# Altium footprint library CONN_HDR_1.27MM_ST_SMD.PcbLib: 118 footprints (part 4 of 8)
Each footprint in its own frame and in the unit in brackets; x right, y up, seen from the top. Pads: shape width x height; smd on the part's side, far side on the other; paste and mask are expansions set on the pad; w line width, h text height; cw(c..) or ccw(c..) is an arc to the next point about the centre after c.
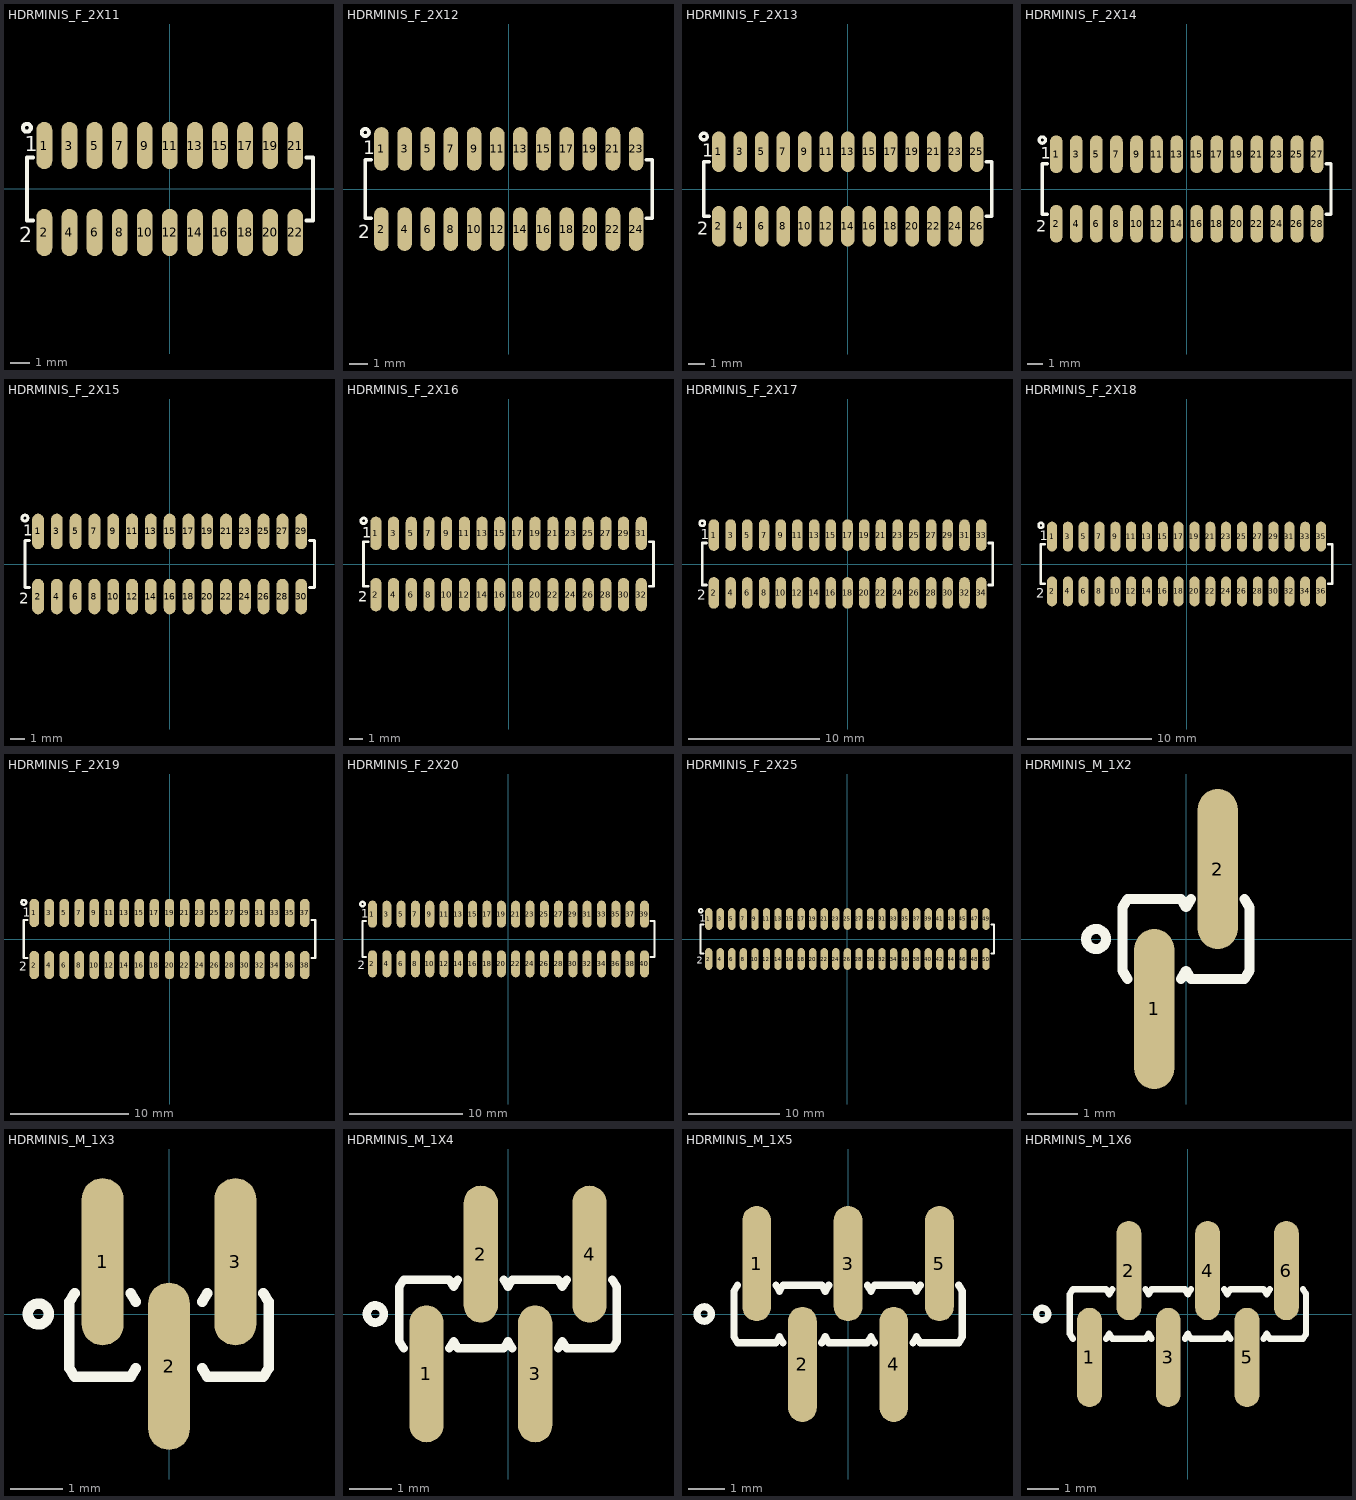
[diagram p3: the footprints below, top view; thin cyan lines are the x and y axes]

## HDRMINIS_F_2X11 [mm] "HEADER FEMALE, SMT, 20, 1.27mm"
pads (22):
  oval 0.8x2.4 smd mask+0.1: 1(-6.35,2.2) 2(-6.35,-2.2) 3(-5.08,2.2) 4(-5.08,-2.2) 5(-3.81,2.2) 6(-3.81,-2.2) 7(-2.54,2.2) 8(-2.54,-2.2) 9(-1.27,2.2) 10(-1.27,-2.2) 11(0,2.2) 12(0,-2.2) 13(1.27,2.2) 14(1.27,-2.2) 15(2.54,2.2) 16(2.54,-2.2) 17(3.81,2.2) 18(3.81,-2.2) 19(5.08,2.2) 20(5.08,-2.2) 21(6.35,2.2) 22(6.35,-2.2)
Top Overlay:
  circle w0.2: c-7.235,3.1 r0.2
  lines w0.2: -6.915,-1.6 -7.235,-1.6 -7.235,1.6 -6.915,1.6 ; 6.915,-1.6 7.235,-1.6 7.235,1.6 6.915,1.6
  text "1" at -7.335,1.9 h0.75
  text "2" at -7.635,-2.7 h0.75
3D body "User Library-1_27x1_27-SMD-female-2x2.step": height 4.5, standoff 0, extent 2.985,-2.3 5.905,2.3
3D body "User Library-1_27x1_27-SMD-female-2x2.step": height 4.5, standoff 0, extent 0.445,-2.3 3.365,2.3
3D body "User Library-1_27x1_27-SMD-female-2x2.step": height 4.5, standoff 0, extent -2.095,-2.3 0.825,2.3
3D body "User Library-1_27x1_27-SMD-female-2x2.step": height 4.5, standoff 0, extent -4.635,-2.3 -1.715,2.3
3D body "User Library-1_27x1_27-SMD-female-2x2.step": height 4.5, standoff 0, extent -7.175,-2.3 -4.255,2.3
3D body "User Library-1_27x1_27-SMD-female-2x2.step": height 4.5, standoff 0, extent 4.255,-2.3 7.175,2.3

## HDRMINIS_F_2X12 [mm] "HEADER FEMALE, SMT, 1.27mm"
pads (24):
  oval 0.8x2.4 smd mask+0.1: 1(-6.985,2.2) 2(-6.985,-2.2) 3(-5.715,2.2) 4(-5.715,-2.2) 5(-4.445,2.2) 6(-4.445,-2.2) 7(-3.175,2.2) 8(-3.175,-2.2) 9(-1.905,2.2) 10(-1.905,-2.2) 11(-0.635,2.2) 12(-0.635,-2.2) 13(0.635,2.2) 14(0.635,-2.2) 15(1.905,2.2) 16(1.905,-2.2) 17(3.175,2.2) 18(3.175,-2.2) 19(4.445,2.2) 20(4.445,-2.2) 21(5.715,2.2) 22(5.715,-2.2) 23(6.985,2.2) 24(6.985,-2.2)
Top Overlay:
  circle w0.2: c-7.87,3.1 r0.2
  lines w0.2: -7.55,-1.6 -7.87,-1.6 -7.87,1.6 -7.55,1.6 ; 7.55,-1.6 7.87,-1.6 7.87,1.6 7.55,1.6
  text "1" at -7.97,1.9 h0.75
  text "2" at -8.27,-2.7 h0.75
3D body "User Library-1_27x1_27-SMD-female-2x2.step": height 4.5, standoff 0, extent 2.35,-2.3 5.27,2.3
3D body "User Library-1_27x1_27-SMD-female-2x2.step": height 4.5, standoff 0, extent -0.19,-2.3 2.73,2.3
3D body "User Library-1_27x1_27-SMD-female-2x2.step": height 4.5, standoff 0, extent -2.73,-2.3 0.19,2.3
3D body "User Library-1_27x1_27-SMD-female-2x2.step": height 4.5, standoff 0, extent -5.27,-2.3 -2.35,2.3
3D body "User Library-1_27x1_27-SMD-female-2x2.step": height 4.5, standoff 0, extent -7.81,-2.3 -4.89,2.3
3D body "User Library-1_27x1_27-SMD-female-2x2.step": height 4.5, standoff 0, extent 4.89,-2.3 7.81,2.3

## HDRMINIS_F_2X13 [mm] "HEADER FEMALE, SMT, 1.27mm"
pads (26):
  oval 0.8x2.4 smd mask+0.1: 1(-7.62,2.2) 2(-7.62,-2.2) 3(-6.35,2.2) 4(-6.35,-2.2) 5(-5.08,2.2) 6(-5.08,-2.2) 7(-3.81,2.2) 8(-3.81,-2.2) 9(-2.54,2.2) 10(-2.54,-2.2) 11(-1.27,2.2) 12(-1.27,-2.2) 13(0,2.2) 14(0,-2.2) 15(1.27,2.2) 16(1.27,-2.2) 17(2.54,2.2) 18(2.54,-2.2) 19(3.81,2.2) 20(3.81,-2.2) 21(5.08,2.2) 22(5.08,-2.2) 23(6.35,2.2) 24(6.35,-2.2) 25(7.62,2.2) 26(7.62,-2.2)
Top Overlay:
  circle w0.2: c-8.505,3.1 r0.2
  lines w0.2: -8.185,-1.6 -8.505,-1.6 -8.505,1.6 -8.185,1.6 ; 8.185,-1.6 8.505,-1.6 8.505,1.6 8.185,1.6
  text "1" at -8.605,1.9 h0.75
  text "2" at -8.905,-2.7 h0.75
3D body "User Library-1_27x1_27-SMD-female-2x2.step": height 4.5, standoff 0, extent 1.715,-2.3 4.635,2.3
3D body "User Library-1_27x1_27-SMD-female-2x2.step": height 4.5, standoff 0, extent -0.825,-2.3 2.095,2.3
3D body "User Library-1_27x1_27-SMD-female-2x2.step": height 4.5, standoff 0, extent -3.365,-2.3 -0.445,2.3
3D body "User Library-1_27x1_27-SMD-female-2x2.step": height 4.5, standoff 0, extent -5.905,-2.3 -2.985,2.3
3D body "User Library-1_27x1_27-SMD-female-2x2.step": height 4.5, standoff 0, extent -8.445,-2.3 -5.525,2.3
3D body "User Library-1_27x1_27-SMD-female-2x2.step": height 4.5, standoff 0, extent 4.255,-2.3 7.175,2.3
3D body "User Library-1_27x1_27-SMD-female-2x2.step": height 4.5, standoff 0, extent 5.525,-2.3 8.445,2.3

## HDRMINIS_F_2X14 [mm] "HEADER FEMALE, SMT, 1.27mm"
pads (28):
  oval 0.8x2.4 smd mask+0.1: 1(-8.255,2.2) 2(-8.255,-2.2) 3(-6.985,2.2) 4(-6.985,-2.2) 5(-5.715,2.2) 6(-5.715,-2.2) 7(-4.445,2.2) 8(-4.445,-2.2) 9(-3.175,2.2) 10(-3.175,-2.2) 11(-1.905,2.2) 12(-1.905,-2.2) 13(-0.635,2.2) 14(-0.635,-2.2) 15(0.635,2.2) 16(0.635,-2.2) 17(1.905,2.2) 18(1.905,-2.2) 19(3.175,2.2) 20(3.175,-2.2) 21(4.445,2.2) 22(4.445,-2.2) 23(5.715,2.2) 24(5.715,-2.2) 25(6.985,2.2) 26(6.985,-2.2) 27(8.255,2.2) 28(8.255,-2.2)
Top Overlay:
  circle w0.2: c-9.14,3.1 r0.2
  lines w0.2: -8.82,-1.6 -9.14,-1.6 -9.14,1.6 -8.82,1.6 ; 8.82,-1.6 9.14,-1.6 9.14,1.6 8.82,1.6
  text "2" at -9.54,-2.7 h0.75
  text "1" at -9.24,1.9 h0.75
3D body "User Library-1_27x1_27-SMD-female-2x2.step": height 4.5, standoff 0, extent 6.16,-2.3 9.08,2.3
3D body "User Library-1_27x1_27-SMD-female-2x2.step": height 4.5, standoff 0, extent 3.62,-2.3 6.54,2.3
3D body "User Library-1_27x1_27-SMD-female-2x2.step": height 4.5, standoff 0, extent -9.08,-2.3 -6.16,2.3
3D body "User Library-1_27x1_27-SMD-female-2x2.step": height 4.5, standoff 0, extent -6.54,-2.3 -3.62,2.3
3D body "User Library-1_27x1_27-SMD-female-2x2.step": height 4.5, standoff 0, extent -4,-2.3 -1.08,2.3
3D body "User Library-1_27x1_27-SMD-female-2x2.step": height 4.5, standoff 0, extent -1.46,-2.3 1.46,2.3
3D body "User Library-1_27x1_27-SMD-female-2x2.step": height 4.5, standoff 0, extent 1.08,-2.3 4,2.3

## HDRMINIS_F_2X15 [mm] "HEADER FEMALE, SMT, 1.27mm"
pads (30):
  oval 0.8x2.4 smd mask+0.1: 1(-8.89,2.2) 2(-8.89,-2.2) 3(-7.62,2.2) 4(-7.62,-2.2) 5(-6.35,2.2) 6(-6.35,-2.2) 7(-5.08,2.2) 8(-5.08,-2.2) 9(-3.81,2.2) 10(-3.81,-2.2) 11(-2.54,2.2) 12(-2.54,-2.2) 13(-1.27,2.2) 14(-1.27,-2.2) 15(0,2.2) 16(0,-2.2) 17(1.27,2.2) 18(1.27,-2.2) 19(2.54,2.2) 20(2.54,-2.2) 21(3.81,2.2) 22(3.81,-2.2) 23(5.08,2.2) 24(5.08,-2.2) 25(6.35,2.2) 26(6.35,-2.2) 27(7.62,2.2) 28(7.62,-2.2) 29(8.89,2.2) 30(8.89,-2.2)
Top Overlay:
  circle w0.2: c-9.775,3.1 r0.2
  lines w0.2: -9.455,-1.6 -9.775,-1.6 -9.775,1.6 -9.455,1.6 ; 9.455,-1.6 9.775,-1.6 9.775,1.6 9.455,1.6
  text "1" at -9.875,1.9 h0.75
  text "2" at -10.175,-2.7 h0.75
3D body "User Library-1_27x1_27-SMD-female-2x2.step": height 4.5, standoff 0, extent 0.445,-2.3 3.365,2.3
3D body "User Library-1_27x1_27-SMD-female-2x2.step": height 4.5, standoff 0, extent -2.095,-2.3 0.825,2.3
3D body "User Library-1_27x1_27-SMD-female-2x2.step": height 4.5, standoff 0, extent -4.635,-2.3 -1.715,2.3
3D body "User Library-1_27x1_27-SMD-female-2x2.step": height 4.5, standoff 0, extent -7.175,-2.3 -4.255,2.3
3D body "User Library-1_27x1_27-SMD-female-2x2.step": height 4.5, standoff 0, extent -9.715,-2.3 -6.795,2.3
3D body "User Library-1_27x1_27-SMD-female-2x2.step": height 4.5, standoff 0, extent 2.985,-2.3 5.905,2.3
3D body "User Library-1_27x1_27-SMD-female-2x2.step": height 4.5, standoff 0, extent 5.525,-2.3 8.445,2.3
3D body "User Library-1_27x1_27-SMD-female-2x2.step": height 4.5, standoff 0, extent 6.795,-2.3 9.715,2.3

## HDRMINIS_F_2X16 [mm] "HEADER FEMALE, SMT, 1.27mm"
pads (32):
  oval 0.8x2.4 smd mask+0.1: 1(-9.525,2.2) 2(-9.525,-2.2) 3(-8.255,2.2) 4(-8.255,-2.2) 5(-6.985,2.2) 6(-6.985,-2.2) 7(-5.715,2.2) 8(-5.715,-2.2) 9(-4.445,2.2) 10(-4.445,-2.2) 11(-3.175,2.2) 12(-3.175,-2.2) 13(-1.905,2.2) 14(-1.905,-2.2) 15(-0.635,2.2) 16(-0.635,-2.2) 17(0.635,2.2) 18(0.635,-2.2) 19(1.905,2.2) 20(1.905,-2.2) 21(3.175,2.2) 22(3.175,-2.2) 23(4.445,2.2) 24(4.445,-2.2) 25(5.715,2.2) 26(5.715,-2.2) 27(6.985,2.2) 28(6.985,-2.2) 29(8.255,2.2) 30(8.255,-2.2) 31(9.525,2.2) 32(9.525,-2.2)
Top Overlay:
  circle w0.2: c-10.41,3.1 r0.2
  lines w0.2: -10.09,-1.6 -10.41,-1.6 -10.41,1.6 -10.09,1.6 ; 10.09,-1.6 10.41,-1.6 10.41,1.6 10.09,1.6
  text "2" at -10.81,-2.7 h0.75
  text "1" at -10.51,1.9 h0.75
3D body "User Library-1_27x1_27-SMD-female-2x2.step": height 4.5, standoff 0, extent 7.43,-2.3 10.35,2.3
3D body "User Library-1_27x1_27-SMD-female-2x2.step": height 4.5, standoff 0, extent 4.89,-2.3 7.81,2.3
3D body "User Library-1_27x1_27-SMD-female-2x2.step": height 4.5, standoff 0, extent 2.35,-2.3 5.27,2.3
3D body "User Library-1_27x1_27-SMD-female-2x2.step": height 4.5, standoff 0, extent -10.35,-2.3 -7.43,2.3
3D body "User Library-1_27x1_27-SMD-female-2x2.step": height 4.5, standoff 0, extent -7.81,-2.3 -4.89,2.3
3D body "User Library-1_27x1_27-SMD-female-2x2.step": height 4.5, standoff 0, extent -5.27,-2.3 -2.35,2.3
3D body "User Library-1_27x1_27-SMD-female-2x2.step": height 4.5, standoff 0, extent -2.73,-2.3 0.19,2.3
3D body "User Library-1_27x1_27-SMD-female-2x2.step": height 4.5, standoff 0, extent -0.19,-2.3 2.73,2.3

## HDRMINIS_F_2X17 [mm] "HEADER FEMALE, SMT, 1.27mm"
pads (34):
  oval 0.8x2.4 smd mask+0.1: 1(-10.16,2.2) 2(-10.16,-2.2) 3(-8.89,2.2) 4(-8.89,-2.2) 5(-7.62,2.2) 6(-7.62,-2.2) 7(-6.35,2.2) 8(-6.35,-2.2) 9(-5.08,2.2) 10(-5.08,-2.2) 11(-3.81,2.2) 12(-3.81,-2.2) 13(-2.54,2.2) 14(-2.54,-2.2) 15(-1.27,2.2) 16(-1.27,-2.2) 17(0,2.2) 18(0,-2.2) 19(1.27,2.2) 20(1.27,-2.2) 21(2.54,2.2) 22(2.54,-2.2) 23(3.81,2.2) 24(3.81,-2.2) 25(5.08,2.2) 26(5.08,-2.2) 27(6.35,2.2) 28(6.35,-2.2) 29(7.62,2.2) 30(7.62,-2.2) 31(8.89,2.2) 32(8.89,-2.2) 33(10.16,2.2) 34(10.16,-2.2)
Top Overlay:
  circle w0.2: c-11.045,3.1 r0.2
  lines w0.2: -10.725,-1.6 -11.045,-1.6 -11.045,1.6 -10.725,1.6 ; 10.725,-1.6 11.045,-1.6 11.045,1.6 10.725,1.6
  text "1" at -11.145,1.9 h0.75
  text "2" at -11.445,-2.7 h0.75
3D body "User Library-1_27x1_27-SMD-female-2x2.step": height 4.5, standoff 0, extent -0.825,-2.3 2.095,2.3
3D body "User Library-1_27x1_27-SMD-female-2x2.step": height 4.5, standoff 0, extent -3.365,-2.3 -0.445,2.3
3D body "User Library-1_27x1_27-SMD-female-2x2.step": height 4.5, standoff 0, extent -5.905,-2.3 -2.985,2.3
3D body "User Library-1_27x1_27-SMD-female-2x2.step": height 4.5, standoff 0, extent -8.445,-2.3 -5.525,2.3
3D body "User Library-1_27x1_27-SMD-female-2x2.step": height 4.5, standoff 0, extent -10.985,-2.3 -8.065,2.3
3D body "User Library-1_27x1_27-SMD-female-2x2.step": height 4.5, standoff 0, extent 1.715,-2.3 4.635,2.3
3D body "User Library-1_27x1_27-SMD-female-2x2.step": height 4.5, standoff 0, extent 4.255,-2.3 7.175,2.3
3D body "User Library-1_27x1_27-SMD-female-2x2.step": height 4.5, standoff 0, extent 6.795,-2.3 9.715,2.3
3D body "User Library-1_27x1_27-SMD-female-2x2.step": height 4.5, standoff 0, extent 8.065,-2.3 10.985,2.3

## HDRMINIS_F_2X18 [mm] "HEADER FEMALE, SMT, 1.27mm"
pads (36):
  oval 0.8x2.4 smd mask+0.1: 1(-10.795,2.2) 2(-10.795,-2.2) 3(-9.525,2.2) 4(-9.525,-2.2) 5(-8.255,2.2) 6(-8.255,-2.2) 7(-6.985,2.2) 8(-6.985,-2.2) 9(-5.715,2.2) 10(-5.715,-2.2) 11(-4.445,2.2) 12(-4.445,-2.2) 13(-3.175,2.2) 14(-3.175,-2.2) 15(-1.905,2.2) 16(-1.905,-2.2) 17(-0.635,2.2) 18(-0.635,-2.2) 19(0.635,2.2) 20(0.635,-2.2) 21(1.905,2.2) 22(1.905,-2.2) 23(3.175,2.2) 24(3.175,-2.2) 25(4.445,2.2) 26(4.445,-2.2) 27(5.715,2.2) 28(5.715,-2.2) 29(6.985,2.2) 30(6.985,-2.2) 31(8.255,2.2) 32(8.255,-2.2) 33(9.525,2.2) 34(9.525,-2.2) 35(10.795,2.2) 36(10.795,-2.2)
Top Overlay:
  circle w0.2: c-11.68,3.1 r0.2
  lines w0.2: -11.36,-1.6 -11.68,-1.6 -11.68,1.6 -11.36,1.6 ; 11.36,-1.6 11.68,-1.6 11.68,1.6 11.36,1.6
  text "1" at -11.78,1.9 h0.75
  text "2" at -12.08,-2.7 h0.75
3D body "User Library-1_27x1_27-SMD-female-2x2.step": height 4.5, standoff 0, extent -1.46,-2.3 1.46,2.3
3D body "User Library-1_27x1_27-SMD-female-2x2.step": height 4.5, standoff 0, extent -4,-2.3 -1.08,2.3
3D body "User Library-1_27x1_27-SMD-female-2x2.step": height 4.5, standoff 0, extent -6.54,-2.3 -3.62,2.3
3D body "User Library-1_27x1_27-SMD-female-2x2.step": height 4.5, standoff 0, extent -9.08,-2.3 -6.16,2.3
3D body "User Library-1_27x1_27-SMD-female-2x2.step": height 4.5, standoff 0, extent -11.62,-2.3 -8.7,2.3
3D body "User Library-1_27x1_27-SMD-female-2x2.step": height 4.5, standoff 0, extent 1.08,-2.3 4,2.3
3D body "User Library-1_27x1_27-SMD-female-2x2.step": height 4.5, standoff 0, extent 3.62,-2.3 6.54,2.3
3D body "User Library-1_27x1_27-SMD-female-2x2.step": height 4.5, standoff 0, extent 6.16,-2.3 9.08,2.3
3D body "User Library-1_27x1_27-SMD-female-2x2.step": height 4.5, standoff 0, extent 8.7,-2.3 11.62,2.3

## HDRMINIS_F_2X19 [mm] "HEADER FEMALE, SMT, 1.27mm"
pads (38):
  oval 0.8x2.4 smd mask+0.1: 1(-11.43,2.2) 2(-11.43,-2.2) 3(-10.16,2.2) 4(-10.16,-2.2) 5(-8.89,2.2) 6(-8.89,-2.2) 7(-7.62,2.2) 8(-7.62,-2.2) 9(-6.35,2.2) 10(-6.35,-2.2) 11(-5.08,2.2) 12(-5.08,-2.2) 13(-3.81,2.2) 14(-3.81,-2.2) 15(-2.54,2.2) 16(-2.54,-2.2) 17(-1.27,2.2) 18(-1.27,-2.2) 19(0,2.2) 20(0,-2.2) 21(1.27,2.2) 22(1.27,-2.2) 23(2.54,2.2) 24(2.54,-2.2) 25(3.81,2.2) 26(3.81,-2.2) 27(5.08,2.2) 28(5.08,-2.2) 29(6.35,2.2) 30(6.35,-2.2) 31(7.62,2.2) 32(7.62,-2.2) 33(8.89,2.2) 34(8.89,-2.2) 35(10.16,2.2) 36(10.16,-2.2) 37(11.43,2.2) 38(11.43,-2.2)
Top Overlay:
  circle w0.2: c-12.315,3.1 r0.2
  lines w0.2: -11.995,-1.6 -12.315,-1.6 -12.315,1.6 -11.995,1.6 ; 11.995,-1.6 12.315,-1.6 12.315,1.6 11.995,1.6
  text "2" at -12.715,-2.7 h0.75
  text "1" at -12.415,1.9 h0.75
3D body "User Library-1_27x1_27-SMD-female-2x2.step": height 4.5, standoff 0, extent 8.065,-2.3 10.985,2.3
3D body "User Library-1_27x1_27-SMD-female-2x2.step": height 4.5, standoff 0, extent 5.525,-2.3 8.445,2.3
3D body "User Library-1_27x1_27-SMD-female-2x2.step": height 4.5, standoff 0, extent 2.985,-2.3 5.905,2.3
3D body "User Library-1_27x1_27-SMD-female-2x2.step": height 4.5, standoff 0, extent 0.445,-2.3 3.365,2.3
3D body "User Library-1_27x1_27-SMD-female-2x2.step": height 4.5, standoff 0, extent -12.255,-2.3 -9.335,2.3
3D body "User Library-1_27x1_27-SMD-female-2x2.step": height 4.5, standoff 0, extent -9.715,-2.3 -6.795,2.3
3D body "User Library-1_27x1_27-SMD-female-2x2.step": height 4.5, standoff 0, extent -7.175,-2.3 -4.255,2.3
3D body "User Library-1_27x1_27-SMD-female-2x2.step": height 4.5, standoff 0, extent -4.635,-2.3 -1.715,2.3
3D body "User Library-1_27x1_27-SMD-female-2x2.step": height 4.5, standoff 0, extent -2.095,-2.3 0.825,2.3
3D body "User Library-1_27x1_27-SMD-female-2x2.step": height 4.5, standoff 0, extent 9.335,-2.3 12.255,2.3

## HDRMINIS_F_2X20 [mm] "HEADER FEMALE, SMT, 1.27mm"
pads (40):
  oval 0.8x2.4 smd mask+0.1: 1(-12.065,2.2) 2(-12.065,-2.2) 3(-10.795,2.2) 4(-10.795,-2.2) 5(-9.525,2.2) 6(-9.525,-2.2) 7(-8.255,2.2) 8(-8.255,-2.2) 9(-6.985,2.2) 10(-6.985,-2.2) 11(-5.715,2.2) 12(-5.715,-2.2) 13(-4.445,2.2) 14(-4.445,-2.2) 15(-3.175,2.2) 16(-3.175,-2.2) 17(-1.905,2.2) 18(-1.905,-2.2) 19(-0.635,2.2) 20(-0.635,-2.2) 21(0.635,2.2) 22(0.635,-2.2) 23(1.905,2.2) 24(1.905,-2.2) 25(3.175,2.2) 26(3.175,-2.2) 27(4.445,2.2) 28(4.445,-2.2) 29(5.715,2.2) 30(5.715,-2.2) 31(6.985,2.2) 32(6.985,-2.2) 33(8.255,2.2) 34(8.255,-2.2) 35(9.525,2.2) 36(9.525,-2.2) 37(10.795,2.2) 38(10.795,-2.2) 39(12.065,2.2) 40(12.065,-2.2)
Top Overlay:
  circle w0.2: c-12.95,3.1 r0.2
  lines w0.2: -12.63,-1.6 -12.95,-1.6 -12.95,1.6 -12.63,1.6 ; 12.63,-1.6 12.95,-1.6 12.95,1.6 12.63,1.6
  text "2" at -13.35,-2.7 h0.75
  text "1" at -13.05,1.9 h0.75
3D body "User Library-1_27x1_27-SMD-female-2x2.step": height 4.5, standoff 0, extent 9.97,-2.3 12.89,2.3
3D body "User Library-1_27x1_27-SMD-female-2x2.step": height 4.5, standoff 0, extent 7.43,-2.3 10.35,2.3
3D body "User Library-1_27x1_27-SMD-female-2x2.step": height 4.5, standoff 0, extent 4.89,-2.3 7.81,2.3
3D body "User Library-1_27x1_27-SMD-female-2x2.step": height 4.5, standoff 0, extent 2.35,-2.3 5.27,2.3
3D body "User Library-1_27x1_27-SMD-female-2x2.step": height 4.5, standoff 0, extent -0.19,-2.3 2.73,2.3
3D body "User Library-1_27x1_27-SMD-female-2x2.step": height 4.5, standoff 0, extent -12.89,-2.3 -9.97,2.3
3D body "User Library-1_27x1_27-SMD-female-2x2.step": height 4.5, standoff 0, extent -10.35,-2.3 -7.43,2.3
3D body "User Library-1_27x1_27-SMD-female-2x2.step": height 4.5, standoff 0, extent -7.81,-2.3 -4.89,2.3
3D body "User Library-1_27x1_27-SMD-female-2x2.step": height 4.5, standoff 0, extent -5.27,-2.3 -2.35,2.3
3D body "User Library-1_27x1_27-SMD-female-2x2.step": height 4.5, standoff 0, extent -2.73,-2.3 0.19,2.3

## HDRMINIS_F_2X25 [mm] "HEADER FEMALE, SMT, 1.27mm"
pads (50):
  oval 0.8x2.4 smd mask+0.1: 1(-15.24,2.2) 2(-15.24,-2.2) 3(-13.97,2.2) 4(-13.97,-2.2) 5(-12.7,2.2) 6(-12.7,-2.2) 7(-11.43,2.2) 8(-11.43,-2.2) 9(-10.16,2.2) 10(-10.16,-2.2) 11(-8.89,2.2) 12(-8.89,-2.2) 13(-7.62,2.2) 14(-7.62,-2.2) 15(-6.35,2.2) 16(-6.35,-2.2) 17(-5.08,2.2) 18(-5.08,-2.2) 19(-3.81,2.2) 20(-3.81,-2.2) 21(-2.54,2.2) 22(-2.54,-2.2) 23(-1.27,2.2) 24(-1.27,-2.2) 25(0,2.2) 26(0,-2.2) 27(1.27,2.2) 28(1.27,-2.2) 29(2.54,2.2) 30(2.54,-2.2) 31(3.81,2.2) 32(3.81,-2.2) 33(5.08,2.2) 34(5.08,-2.2) 35(6.35,2.2) 36(6.35,-2.2) 37(7.62,2.2) 38(7.62,-2.2) 39(8.89,2.2) 40(8.89,-2.2) 41(10.16,2.2) 42(10.16,-2.2) 43(11.43,2.2) 44(11.43,-2.2) 45(12.7,2.2) 46(12.7,-2.2) 47(13.97,2.2) 48(13.97,-2.2) 49(15.24,2.2) 50(15.24,-2.2)
Top Overlay:
  circle w0.2: c-16.125,3.1 r0.2
  lines w0.2: -15.805,-1.6 -16.125,-1.6 -16.125,1.6 -15.805,1.6 ; 15.805,-1.6 16.125,-1.6 16.125,1.6 15.805,1.6
  text "1" at -16.225,1.9 h0.75
  text "2" at -16.525,-2.7 h0.75
3D body "User Library-1_27x1_27-SMD-female-2x2.step": height 4.5, standoff 0, extent 13.145,-2.3 16.065,2.3
3D body "User Library-1_27x1_27-SMD-female-2x2.step": height 4.5, standoff 0, extent 11.875,-2.3 14.795,2.3
3D body "User Library-1_27x1_27-SMD-female-2x2.step": height 4.5, standoff 0, extent 9.335,-2.3 12.255,2.3
3D body "User Library-1_27x1_27-SMD-female-2x2.step": height 4.5, standoff 0, extent -5.905,-2.3 -2.985,2.3
3D body "User Library-1_27x1_27-SMD-female-2x2.step": height 4.5, standoff 0, extent -8.445,-2.3 -5.525,2.3
3D body "User Library-1_27x1_27-SMD-female-2x2.step": height 4.5, standoff 0, extent -10.985,-2.3 -8.065,2.3
3D body "User Library-1_27x1_27-SMD-female-2x2.step": height 4.5, standoff 0, extent -13.525,-2.3 -10.605,2.3
3D body "User Library-1_27x1_27-SMD-female-2x2.step": height 4.5, standoff 0, extent -16.065,-2.3 -13.145,2.3
3D body "User Library-1_27x1_27-SMD-female-2x2.step": height 4.5, standoff 0, extent -3.365,-2.3 -0.445,2.3
3D body "User Library-1_27x1_27-SMD-female-2x2.step": height 4.5, standoff 0, extent -0.825,-2.3 2.095,2.3
3D body "User Library-1_27x1_27-SMD-female-2x2.step": height 4.5, standoff 0, extent 1.715,-2.3 4.635,2.3
3D body "User Library-1_27x1_27-SMD-female-2x2.step": height 4.5, standoff 0, extent 4.255,-2.3 7.175,2.3
3D body "User Library-1_27x1_27-SMD-female-2x2.step": height 4.5, standoff 0, extent 6.795,-2.3 9.715,2.3

## HDRMINIS_M_1X2 [mm] "mini header (50mil pitch)"
pads (2):
  oval 0.8x3.2 smd mask+0.1: 1(-0.635,-1.4) 2(0.635,1.4)
Top Overlay:
  circle w0.2: c-1.8,0 r0.2
  lines w0.2: -1.171,-0.8 -1.27,-0.635 -1.27,0.635 -1.171,0.8 -0.099,0.8 0,0.635 0.099,0.8 ; -0.099,-0.8 0,-0.635 0.099,-0.8 1.171,-0.8 1.27,-0.635 1.27,0.635 1.171,0.8
3D body "BD021-02A-A1-0350-0200-0550-LB.stp": height 5.5, standoff 0, extent -1.27,-2.75 1.27,2.75

## HDRMINIS_M_1X3 [mm] "mini header (50mil pitch)"
pads (3):
  oval 0.8x3.2 smd mask+0.1: 1(-1.27,1) 2(0,-1) 3(1.27,1)
Top Overlay:
  circle w0.2: c-2.5,0 r0.2
  lines w0.2: -1.806,0.4 -1.905,0.235 -1.905,-1.035 -1.806,-1.2 -0.734,-1.2 -0.635,-1.035 ; -0.734,0.4 -0.635,0.235 ; 0.635,-1.035 0.734,-1.2 1.806,-1.2 1.905,-1.035 1.905,0.235 1.806,0.4 ; 0.635,0.235 0.734,0.4
3D body "BD021-03A-A1-0350-0200-0550-LB.stp": height 5.5, standoff 0, extent -1.91,-2.75 1.9,2.75

## HDRMINIS_M_1X4 [mm] "mini header (50mil pitch)"
pads (4):
  oval 0.8x3.2 smd mask+0.1: 1(-1.905,-1.4) 2(-0.635,1.4) 3(0.635,-1.4) 4(1.905,1.4)
Top Overlay:
  circle w0.2: c-3.1,0 r0.2
  lines w0.2: -2.441,-0.8 -2.54,-0.635 -2.54,0.635 -2.441,0.8 -1.369,0.8 -1.27,0.635 -1.171,0.8 ; -1.369,-0.8 -1.27,-0.635 -1.171,-0.8 -0.099,-0.8 0,-0.635 0.099,-0.8 ; -0.099,0.8 0,0.635 0.099,0.8 1.171,0.8 1.27,0.635 1.369,0.8 ; 1.171,-0.8 1.27,-0.635 1.369,-0.8 2.441,-0.8 2.54,-0.635 2.54,0.635 2.441,0.8
3D body "BD021-02A-A1-0350-0200-0550-LB.stp": height 5.5, standoff 0, extent -2.54,-2.75 0,2.75
3D body "BD021-02A-A1-0350-0200-0550-LB.stp": height 5.5, standoff 0, extent 0,-2.75 2.54,2.75

## HDRMINIS_M_1X5 [mm] "mini header (50mil pitch)"
pads (5):
  oval 0.8x3.2 smd mask+0.1: 1(-2.54,1.4) 2(-1.27,-1.4) 3(0,1.4) 4(1.27,-1.4) 5(2.54,1.4)
Top Overlay:
  circle w0.2: c-4,0 r0.2
  lines w0.2: -3.076,0.8 -3.175,0.635 -3.175,-0.635 -3.076,-0.8 -2.004,-0.8 -1.905,-0.635 -1.806,-0.8 ; -2.004,0.8 -1.905,0.635 -1.806,0.8 -0.734,0.8 -0.635,0.635 -0.536,0.8 ; -0.734,-0.8 -0.635,-0.635 -0.536,-0.8 0.536,-0.8 0.635,-0.635 0.734,-0.8 ; 0.536,0.8 0.635,0.635 0.734,0.8 1.806,0.8 1.905,0.635 2.004,0.8 ; 1.806,-0.8 1.905,-0.635 2.004,-0.8 3.076,-0.8 3.175,-0.635 3.175,0.635 3.076,0.8
3D body "BD021-03A-A1-0350-0200-0550-LB.stp": height 5.5, standoff 0, extent -3.18,-2.75 0.63,2.75
3D body "BD021-02A-A1-0350-0200-0550-LB.stp": height 5.5, standoff 0, extent 0.635,-2.75 3.175,2.75

## HDRMINIS_M_1X6 [mm] "mini header (50mil pitch)"
pads (6):
  oval 0.8x3.2 smd mask+0.1: 1(-3.175,-1.4) 2(-1.905,1.4) 3(-0.635,-1.4) 4(0.635,1.4) 5(1.905,-1.4) 6(3.175,1.4)
Top Overlay:
  circle w0.2: c-4.7,0 r0.2
  lines w0.2: -3.711,-0.8 -3.81,-0.635 -3.81,0.635 -3.711,0.8 -2.639,0.8 -2.54,0.635 -2.441,0.8 ; -2.639,-0.8 -2.54,-0.635 -2.441,-0.8 -1.369,-0.8 -1.27,-0.635 -1.171,-0.8 ; -1.369,0.8 -1.27,0.635 -1.171,0.8 -0.099,0.8 0,0.635 0.099,0.8 ; -0.099,-0.8 0,-0.635 0.099,-0.8 1.171,-0.8 1.27,-0.635 1.369,-0.8 ; 1.171,0.8 1.27,0.635 1.369,0.8 2.441,0.8 2.54,0.635 2.639,0.8 ; 2.441,-0.8 2.54,-0.635 2.639,-0.8 3.711,-0.8 3.81,-0.635 3.81,0.635 3.711,0.8
3D body "BD021-02A-A1-0350-0200-0550-LB.stp": height 5.5, standoff 0, extent 1.27,-2.75 3.81,2.75
3D body "BD021-02A-A1-0350-0200-0550-LB.stp": height 5.5, standoff 0, extent -1.27,-2.75 1.27,2.75
3D body "BD021-02A-A1-0350-0200-0550-LB.stp": height 5.5, standoff 0, extent -3.81,-2.75 -1.27,2.75